# Altium footprint library PcbLib1.PcbLib: 49 footprints (part 1 of 4)
Each footprint in its own frame and in the unit in brackets; x right, y up, seen from the top. Pads: shape width x height; smd on the part's side, far side on the other; paste and mask are expansions set on the pad; w line width, h text height; cw(c..) or ccw(c..) is an arc to the next point about the centre after c.
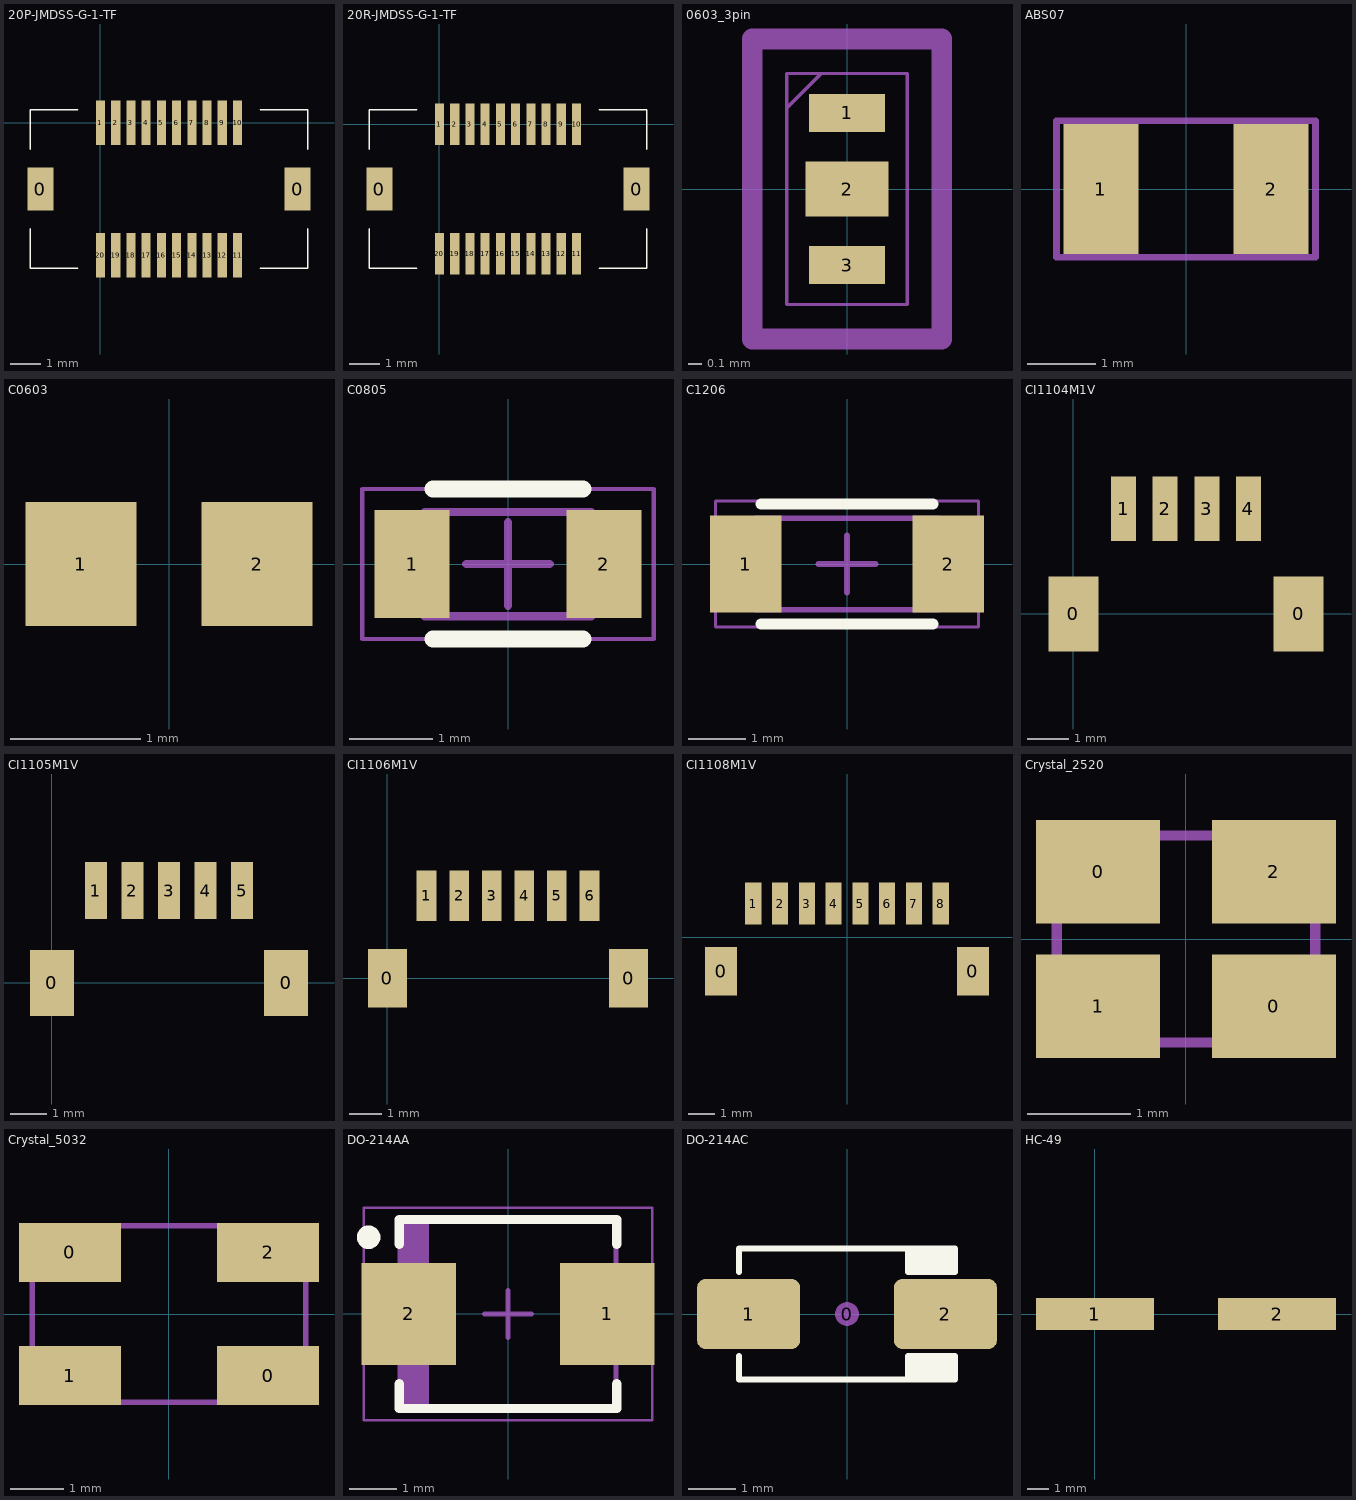
[diagram p0: the footprints below, top view; thin cyan lines are the x and y axes]

## 20P-JMDSS-G-1-TF [mm] "20 pin plug"
pads (22):
  rect 0.85x1.4 smd: 0(-1.975,-2.175) 0(6.475,-2.175)
  rect 0.3x1.45 smd: 1(0,0) 2(0.5,0) 3(1,0) 4(1.5,0) 5(2,0) 6(2.5,0) 7(3,0) 8(3.5,0) 9(4,0) 10(4.5,0) 11(4.5,-4.35) 12(4,-4.35) 13(3.5,-4.35) 14(3,-4.35) 15(2.5,-4.35) 16(2,-4.35) 17(1.5,-4.35) 18(1,-4.35) 19(0.5,-4.35) 20(0,-4.35)
Top Overlay:
  lines w0.05: -2.3,-3.475 -2.3,-4.775 -0.75,-4.775 ; -2.3,-0.875 -2.3,0.425 -0.75,0.425 ; 5.25,-4.775 6.8,-4.775 6.8,-3.475 ; 5.25,0.425 6.8,0.425 6.8,-0.875

## 20R-JMDSS-G-1-TF [mm] "20 pin Receptacle"
pads (22):
  rect 0.85x1.4 smd: 0(-1.975,-2.125) 0(6.475,-2.125)
  rect 0.3x1.35 smd: 1(0,0) 2(0.5,0) 3(1,0) 4(1.5,0) 5(2,0) 6(2.5,0) 7(3,0) 8(3.5,0) 9(4,0) 10(4.5,0) 11(4.5,-4.25) 12(4,-4.25) 13(3.5,-4.25) 14(3,-4.25) 15(2.5,-4.25) 16(2,-4.25) 17(1.5,-4.25) 18(1,-4.25) 19(0.5,-4.25) 20(0,-4.25)
Top Overlay:
  lines w0.05: -2.3,-3.425 -2.3,-4.725 -0.75,-4.725 ; -2.3,-0.825 -2.3,0.475 -0.75,0.475 ; 5.25,-4.725 6.8,-4.725 6.8,-3.425 ; 5.25,0.475 6.8,0.475 6.8,-0.825

## 0603_3pin [mil]
pads (3):
  rect 22x11 smd paste+0 mask+0: 1(0,22.05) 3(0,-22.05)
  rect 24x16 smd paste+0 mask+0: 2(0,0)
Mechanical 13:
  lines w1: -17.5,23.5 -7.5,33.5 ; -17.5,-33.5 -17.5,0 -17.5,33.5 17.5,33.5 17.5,0 17.5,-33.5 -17.5,-33.5
Mechanical 15:
  lines w6: -27.5,-43.5 -27.5,43.5 27.5,43.5 27.5,-43.5 -27.5,-43.5
3D body "cap0603.step": height 35.43, standoff 0, extent -15.75,-31.49 15.75,31.51

## ABS07 [mm] "32.768"
pads (2):
  rect 1.1x1.9 smd: 1(-1.25,0) 2(1.25,0)
Mechanical 15:
  lines w0.1: -1.9,-1 1.9,-1 1.9,1 -1.9,1 -1.9,-1
  text ".Designator" at -1.7,-0.1 h0.5
3D body "ABS07.STEP": height 0.91, standoff 0, extent -1.61,-0.76 1.61,0.76

## C0603 [mm]
pads (2):
  rect 0.85x0.95 smd: 1(-0.675,0) 2(0.675,0)
3D body "cap0603.step": height 0.9, standoff 0, extent -0.8,-0.4 0.8,0.4

## C0805 [mm] "Chip Capacitor, 2-Leads, Body 2,00x1,25mm, IPC Medium Density"
height 1.45
pads (2):
  rect 0.9x1.3 smd: 1(-1.15,0) 2(1.15,0)
Top Overlay:
  lines w0.2: -0.9,-0.9 0.9,-0.9 ; -0.9,0.9 0.9,0.9
Mechanical 13:
  lines w0.1: -1,-0.625 -1,0.625 1,0.625 1,-0.625 -1,-0.625
Mechanical 15:
  lines w0.05: -1.75,-0.9 -1.75,0.9 1.75,0.9 1.75,-0.9 -1.75,-0.9
  lines w0.1: -0.5,0 0.5,0 ; 0,-0.5 0,0.5
3D body "Chip Capacitor 0805.step": height 1.32, standoff 0, extent -1,-0.635 1,0.635

## C1206 [mm] "Chip Capacitor, 2-Leads, Body 3,20x1,60mm, IPC Medium Density"
height 1.75
pads (2):
  rect 1.25x1.7 smd: 1(-1.775,0) 2(1.775,0)
Top Overlay:
  lines w0.2: -1.5,-1.05 1.5,-1.05 ; -1.5,1.05 1.5,1.05
Mechanical 13:
  lines w0.1: -1.6,-0.8 -1.6,0.8 1.6,0.8 1.6,-0.8 -1.6,-0.8
Mechanical 15:
  lines w0.05: -2.3,-1.1 -2.3,1.1 2.3,1.1 2.3,-1.1 -2.3,-1.1
  lines w0.1: -0.5,0 0.5,0 ; 0,-0.5 0,0.5
3D body "Chip Capacitor 1206.step": height 1.52, standoff 0, extent -1.6,-0.81 1.6,0.81

## CI1104М1V [mm] "4pin"
pads (6):
  rect 1.2x1.8 smd: 0(0,0) 0(5.4,0)
  rect 0.6x1.55 smd: 1(1.2,2.525) 2(2.2,2.525) 3(3.2,2.525) 4(4.2,2.525)

## CI1105М1V [mm] "5pin"
pads (7):
  rect 1.2x1.8 smd: 0(0,0) 0(6.4,0)
  rect 0.6x1.55 smd: 1(1.2,2.525) 2(2.2,2.525) 3(3.2,2.525) 4(4.2,2.525) 5(5.2,2.525)

## CI1106М1V [mm] "6pin"
pads (8):
  rect 1.2x1.8 smd: 0(0,0) 0(7.4,0)
  rect 0.6x1.55 smd: 1(1.2,2.525) 2(2.2,2.525) 3(3.2,2.525) 4(4.2,2.525) 5(5.2,2.525) 6(6.2,2.525)

## CI1108М1V [mm] "8pin"
pads (10):
  rect 1.2x1.8 smd: 0(-4.7,-1.262) 0(4.7,-1.262)
  rect 0.6x1.55 smd: 1(-3.5,1.262) 2(-2.5,1.262) 3(-1.5,1.262) 4(-0.5,1.262) 5(0.5,1.262) 6(1.5,1.262) 7(2.5,1.262) 8(3.5,1.262)
3D body: height 4.25, standoff 0, extent -5,-1.862 5,1.038

## Crystal_2520 [mm]
pads (4):
  rect 1.2x1 smd: 0(-0.85,0.65) 0(0.85,-0.65) 1(-0.85,-0.65) 2(0.85,0.65)
Mechanical 15:
  lines w0.1: -1.25,-1.001 -1.25,1 1.251,1 1.251,-1.001 -1.25,-1.001
  text ".Designator" at -0.925,-0.2 h0.5
3D body "NX2520SA.step": height 0.65, standoff 0, extent -1.251,-1.001 1.251,1.001

## Crystal_5032 [mm]
pads (4):
  rect 1.9x1.1 smd: 0(-1.85,1.15) 0(1.85,-1.15) 1(-1.85,-1.15) 2(1.85,1.15)
Mechanical 15:
  lines w0.1: -2.55,-1.65 -2.55,1.65 -0.55,1.65 2.55,1.65 2.55,-1.65 -2.55,-1.65
  text ".Designator" at -1.55,-0.05 h0.5
3D body "CRYSTALSMD5X32.step": height 1, standoff 0, extent -2.5,-1.6 2.5,1.6

## DO-214AA [mm] "Molded Diode, 2-Leads, Body 4,31x3,62mm, IPC Medium Density"
height 2.62
pads (2):
  rect 2x2.15 smd: 1(2.1,0) 2(-2.1,0)
Top Overlay:
  circle w0.25: c-2.95,1.625 r0.125
  lines w0.2: -2.3,-1.475 -2.3,-2 2.3,-2 2.3,-1.475 ; -2.3,1.475 -2.3,2 2.3,2 2.3,1.475
Mechanical 13:
  rectangle: -2.285,-1.97 -1.67,1.97
  lines w0.1: -2.285,-1.97 -2.285,1.97 2.285,1.97 2.285,-1.97 -2.285,-1.97
Mechanical 15:
  lines w0.05: -3.05,-2.25 -3.05,2.25 3.05,2.25 3.05,-2.25 -3.05,-2.25
  lines w0.1: -0.5,0 0.5,0 ; 0,-0.5 0,0.5
3D body "User Library-DIOM5539X24.step": height 2.45, standoff 0.03, extent -2.75,-1.95 2.75,1.95

## DO-214AC [mm] "JEDEC DO214 variation AC. SMA"
height 2.5
pads (3):
  round 0.508 on Mech15: 0(0,0)
  rrect25% 2.2x1.5 smd: 1(-2.1,0) 2(2.1,0)
Top Overlay:
  rectangle: 1.3,0.9 2.3,1.4
  rectangle: 1.3,-1.4 2.3,-0.9
  lines w0.127: -2.3,-0.9 -2.3,-1.4 2.3,-1.4 2.3,-0.9 1.3,-0.9 1.3,-1.4 ; -2.3,0.9 -2.3,1.4 2.3,1.4 2.3,0.9 1.3,0.9 ; 1.3,0.911 1.3,1.4
3D body "SW3dPS-DO-214AC SMA.STEP": height 2.42, standoff 0.02, extent -2.6,-1.3 2.6,1.3

## HC-49 [mm]
pads (2):
  rect 5.5x1.5 smd: 1(0,0) 2(8.5,0)
3D body "HC49_SMD.step": height 4.3, standoff 0, extent -1.9,-2.25 10.4,2.25